# Altium footprint library Pcblib.PcbLib: 281 footprints (part 2 of 18)
Each footprint in its own frame and in the unit in brackets; x right, y up, seen from the top. Pads: shape width x height; smd on the part's side, far side on the other; paste and mask are expansions set on the pad; w line width, h text height; cw(c..) or ccw(c..) is an arc to the next point about the centre after c.
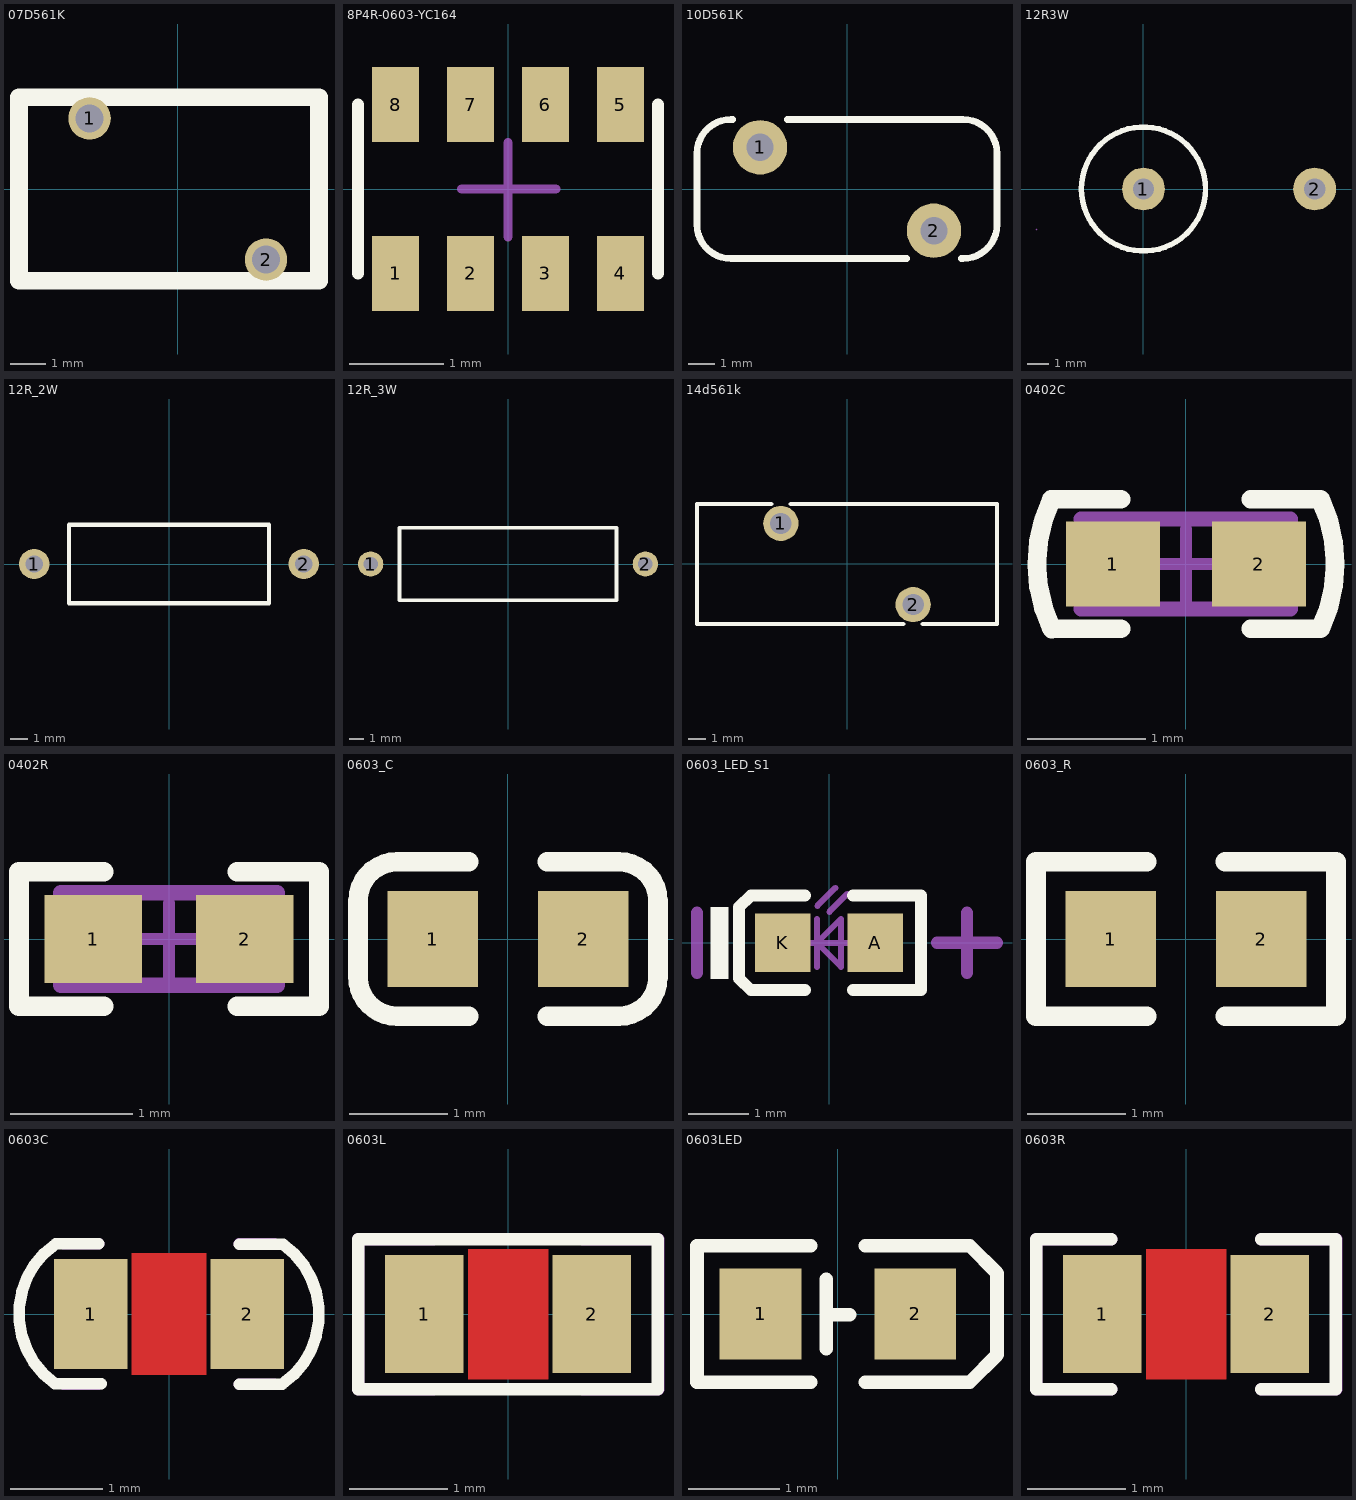
[diagram p1: the footprints below, top view; thin cyan lines are the x and y axes]

## 07D561K [mm]
height 17.5
pads (2):
  round 1.2 hole 0.8: 1(-2.5,2) 2(2.5,-2)
Top Overlay:
  lines w0.508: -4.5,-2.6 -4.5,2.6 4,2.6 4,-2.6 -4.5,-2.6

## 8P4R-0603-YC164 [mm]
height 0.6
pads (8):
  rect 0.5x0.8 smd: 1(-1.2,-0.9) 2(-0.4,-0.9) 3(0.4,-0.9) 4(1.2,-0.9) 5(1.2,0.9) 6(0.4,0.9) 7(-0.4,0.9) 8(-1.2,0.9)
Top Overlay:
  lines w0.127: -1.6,-0.9 -1.6,0.9 ; 1.6,-0.9 1.6,0.9
Mechanical 15:
  lines w0.1: -0.492,0 0.508,0 ; 0,-0.508 0,0.492
3D body: height 1.1, standoff 0, extent -1.397,-0.762 1.397,0.762
3D body: height 1.1, standoff 0, extent 0.889,1.016 1.524,1.27
3D body: height 1.1, standoff 0, extent 0.127,1.016 0.635,1.27
3D body: height 1.1, standoff 0, extent -0.635,1.016 -0.127,1.27
3D body: height 1.1, standoff 0, extent 0.889,-1.143 1.524,-0.889
3D body: height 1.1, standoff 0, extent -0.635,-1.143 -0.127,-0.889
3D body: height 1.1, standoff 0, extent 0.127,-1.143 0.635,-0.889
3D body: height 1.1, standoff 0, extent -1.524,-1.143 -0.889,-0.889
3D body: height 1.1, standoff 0, extent -1.524,1.016 -0.889,1.27

## 10D561K [mil]
pads (2):
  round 80 hole 40: 1(-127.83,61.22) 2(127.83,-61.22)
Top Overlay:
  lines w10: -167.83,102.36 -170.47,102.36 ccw(c-170.47,52.36) -220.47,52.36 -220.47,-52.36 ccw(c-170.47,-52.36) -170.47,-102.36 87.83,-102.36 ; -87.83,102.36 170.47,102.36 cw(c170.47,52.36) 220.47,52.36 220.47,-52.36 cw(c170.47,-52.36) 170.47,-102.36 167.83,-102.36

## 12R3W [mm] "绕线电阻"
height 0.8
pads (2):
  round 2 hole 1: 1(0,0) 2(8,0)
Top Overlay:
  circle w0.254: c0,0 r2.9
Mechanical 15:
  lines w0.003: -5.025,-1.906 -4.975,-1.855

## 12R_2W [mm]
pads (2):
  round 1.75 hole 1: 1(-7.75,0) 2(7.75,0)
Top Overlay:
  lines w0.254: -5.75,-2.25 5.75,-2.25 5.75,2.25 -5.75,2.25 -5.75,-2.25

## 12R_3W [mm]
pads (2):
  round 1.75 hole 1: 1(-9.5,0) 2(9.5,0)
Top Overlay:
  lines w0.254: -7.5,-2.5 7.5,-2.5 7.5,2.5 -7.5,2.5 -7.5,-2.5

## 14d561k [mm]
pads (2):
  round 2 hole 1.2: 1(-3.75,2.3) 2(3.75,-2.3)
Top Overlay:
  lines w0.254: -4.3,3.4 -8.5,3.4 -8.5,-3.4 3.2,-3.4 ; -3.2,3.4 8.5,3.4 8.5,-3.4 4.3,-3.4

## 0402C [mm]
height 0.5
pads (2):
  rect 0.8x0.72 smd: 1(-0.62,0) 2(0.62,0)
Top Overlay:
  lines w0.16: -1.143,0.544 ccw(c0.004,0) -1.139,-0.553 ; -1.143,0.55 -0.55,0.55 ; -1.139,-0.55 -0.55,-0.55 ; 0.55,-0.55 1.143,-0.55 ; 0.55,0.55 1.143,0.55 ; 1.143,-0.548 ccw(c-0.003,0) 1.143,0.548
Mechanical 13:
  lines w0.127: -0.889,0.381 0.888,0.381 ; -0.888,0.381 -0.889,-0.381 0.888,-0.381 0.889,0.381
Mechanical 15:
  lines w0.1: -0.295,0 0.305,0 ; 0,-0.305 0,0.295
3D body: height 1.1, standoff 0, extent 0.635,-0.381 0.888,0.381
3D body: height 0.6, standoff 0, extent -0.635,-0.381 0.635,0.381
3D body: height 1.1, standoff 0, extent -0.889,-0.381 -0.636,0.381

## 0402R [mm]
height 0.5
pads (2):
  rect 0.8x0.72 smd: 1(-0.62,0) 2(0.62,0)
Top Overlay:
  lines w0.16: -0.533,-0.55 -1.23,-0.55 -1.23,0.55 -0.533,0.55 ; 0.559,-0.55 1.23,-0.55 1.23,0.55 0.559,0.55
Mechanical 13:
  lines w0.127: -0.889,0.381 0.888,0.381 ; -0.888,0.381 -0.889,-0.381 0.888,-0.381 0.889,0.381
Mechanical 15:
  lines w0.1: -0.295,0 0.305,0 ; 0,-0.305 0,0.295
3D body: height 1.1, standoff 0, extent 0.635,-0.381 0.888,0.381
3D body: height 0.6, standoff 0, extent -0.635,-0.381 0.635,0.381
3D body: height 1.1, standoff 0, extent -0.889,-0.381 -0.636,0.381

## 0603_C [mm]
pads (2):
  rect 0.93x0.98 smd: 1(-0.77,0) 2(0.77,0)
Top Overlay:
  lines w0.2: -0.4,-0.79 -1.135,-0.79 cw(c-1.135,-0.39) -1.535,-0.39 -1.535,0.39 cw(c-1.135,0.39) -1.135,0.79 -0.4,0.79 ; 0.4,-0.79 1.135,-0.79 ccw(c1.135,-0.39) 1.535,-0.39 1.535,0.39 ccw(c1.135,0.39) 1.135,0.79 0.4,0.79
3D body "User Library-0603 SMD Capacitor.STEP": height 0.3, standoff 0, extent -0.8,-0.4 0.8,0.4

## 0603_LED_S1 [mm]
pads (2):
  rect 0.93x0.98 smd: A(0.77,0) K(-0.77,0)
Top Overlay:
  rectangle: -1.975,-0.6 -1.675,0.6
  lines w0.2: -0.4,-0.79 -1.3,-0.79 -1.5,-0.597 -1.5,0.597 -1.3,0.79 -0.4,0.79 ; 0.4,-0.79 1.535,-0.79 1.535,0.79 0.4,0.79
Mechanical 13:
  lines w0.1: -0.4,0 0.4,0 ; -0.2,-0.4 -0.2,0.4 ; -0.195,0.617 0.105,0.917 ; 0.005,0.517 0.305,0.817 ; -0.2,0 0.2,0.4 0.2,-0.4 -0.2,0
Mechanical 15:
  lines w0.203: -2.2,-0.5 -2.2,0.5 ; 1.8,0 2.8,0 ; 2.3,-0.5 2.3,0.5
3D body "User Library-LED_0603_R.STEP": height 0.6, standoff 0, extent -0.8,-0.4 0.8,0.4

## 0603_R [mm]
pads (2):
  rect 0.93x0.98 smd: 1(-0.77,0) 2(0.77,0)
Top Overlay:
  lines w0.2: -0.4,-0.79 -1.535,-0.79 -1.535,0.79 -0.4,0.79 ; 0.4,-0.79 1.535,-0.79 1.535,0.79 0.4,0.79
3D body "User Library-RES_1609-0603.STEP": height 0.56, standoff 0, extent -0.85,-0.4 0.85,0.4

## 0603C [mm]
height 0.6
pads (2):
  rect 0.8x1.2 smd: 1(-0.85,0) 2(0.85,0)
Top Layer:
  pour cut-out: -0.406,0.66 0.406,0.66 0.406,-0.66 -0.406,-0.66
Top Overlay:
  lines w0.127: -1.232,0.762 -0.762,0.762 ; -1.232,0.763 ccw(c-0.7,0) -1.241,-0.756 -0.737,-0.756 ; 0.762,-0.763 1.232,-0.763 ccw(c0.7,0) 1.241,0.756 0.762,0.756
Mechanical 5:
  lines w0.127: -1.143,-0.762 -0.762,-0.762 ; -1.143,0.762 -0.762,0.762 ; 0.762,-0.762 1.143,-0.762 ; 0.762,0.762 1.143,0.762
Mechanical 15:
  lines w0.1: -0.254,0 0.254,0 ; 0,-0.254 0,0.254
3D body: height 0.53, standoff 0.02, extent -0.762,-0.635 0.763,0.635
3D body: height 1.1, standoff 0, extent -1.143,-0.635 -0.762,0.635
3D body: height 1.1, standoff 0, extent 0.763,-0.635 1.143,0.635

## 0603L [mm]
height 0.6
pads (2):
  rect 0.8x1.2 smd: 1(-0.85,0) 2(0.85,0)
Top Layer:
  pour cut-out: -0.406,0.66 0.406,0.66 0.406,-0.66 -0.406,-0.66
Top Overlay:
  lines w0.127: -1.52,-0.762 0.762,-0.762 1.52,-0.762 1.52,0.762 0.762,0.762 -1.52,0.762 -1.52,-0.762
Mechanical 5:
  lines w0.127: -0.762,-0.762 -1.524,-0.762 -1.524,0.762 -0.762,0.762 ; 0.762,-0.762 1.524,-0.762 1.524,0.762 0.762,0.762
Mechanical 15:
  lines w0.1: -0.3,0 0.3,0 ; 0,-0.3 0,0.3
3D body: height 0.53, standoff 0.02, extent -1.143,-0.635 1.143,0.635

## 0603LED [mm]
pads (2):
  rect 0.9x1 smd: 1(-0.85,0) 2(0.85,0)
Top Overlay:
  lines w0.15: -1.55,-0.75 -0.3,-0.75 ; -1.55,-0.75 -1.55,0.73 ; -1.55,0.75 -0.3,0.75 ; -0.127,-0.381 -0.127,0.381 ; -0.127,-0.006 0.127,-0.006 ; 0.3,-0.75 1.45,-0.75 1.75,-0.45 1.75,-0.35 1.75,0.35 1.75,0.45 1.45,0.75 0.3,0.75
Mechanical 15:
  region: -0.865,-0.273 -0.865,0.327 -0.715,0.327 -0.715,-0.273
  region: 0.6,0.1 1.2,0.1 1.2,-0.05 0.6,-0.05
  region: -1.1,0.1 -0.5,0.1 -0.5,-0.05 -1.1,-0.05

## 0603R [mm]
height 0.6
pads (2):
  rect 0.8x1.2 smd: 1(-0.85,0) 2(0.85,0)
Top Layer:
  pour cut-out: -0.406,0.66 0.406,0.66 0.406,-0.66 -0.406,-0.66
Top Overlay:
  lines w0.127: -0.762,-0.762 -1.52,-0.762 -1.52,0.762 -0.762,0.762 ; 0.762,-0.762 1.52,-0.762 1.52,0.762 0.762,0.762
Mechanical 5:
  lines w0.127: -0.762,-0.762 -1.524,-0.762 -1.524,0.762 -0.762,0.762 ; 0.762,-0.762 1.524,-0.762 1.524,0.762 0.762,0.762
Mechanical 15:
  lines w0.1: -0.3,0 0.3,0 ; 0,-0.3 0,0.3
3D body: height 0.53, standoff 0.02, extent -1.143,-0.635 1.143,0.635